# Altium footprint library MODULE.PcbLib: 35 footprints (part 3 of 3)
Each footprint in its own frame and in the unit in brackets; x right, y up, seen from the top. Pads: shape width x height; smd on the part's side, far side on the other; paste and mask are expansions set on the pad; w line width, h text height; cw(c..) or ccw(c..) is an arc to the next point about the centre after c.
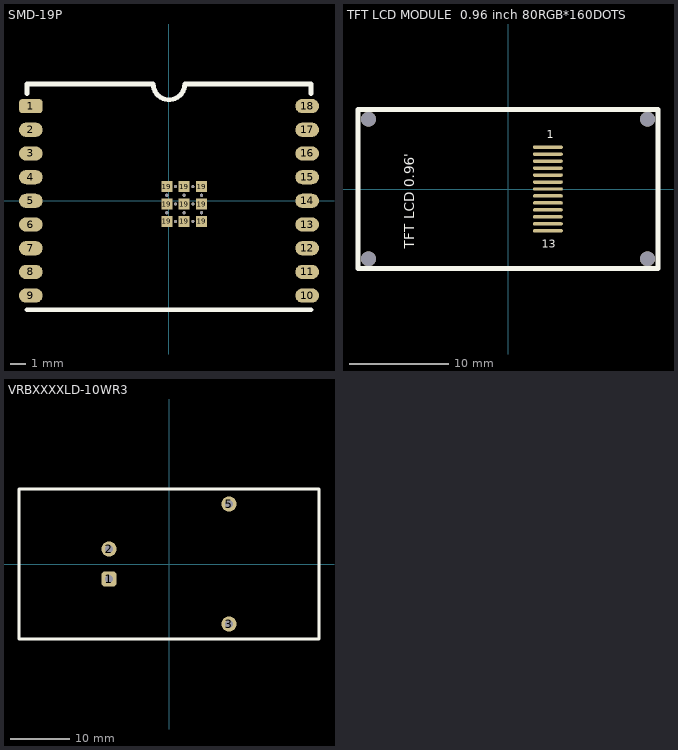
[diagram p2: the footprints below, top view; thin cyan lines are the x and y axes]

## SMD-19P [mm]
pads (39):
  rrect50% 1.5x0.9 smd mask+0.1: 1(-8.75,6)
  oval 1.5x0.9 smd mask+0.1: 2(-8.75,4.5) 3(-8.75,3) 4(-8.75,1.5) 5(-8.75,0) 6(-8.75,-1.5) 7(-8.75,-3) 8(-8.75,-4.5) 9(-8.75,-6) 10(8.75,-6) 11(8.75,-4.5) 12(8.75,-3) 13(8.75,-1.5) 14(8.75,0) 15(8.75,1.5) 16(8.75,3) 17(8.75,4.5) 18(8.75,6)
  rect 0.7x0.7 smd mask+0.1: 19(-0.14,-1.3) 19(-0.14,-0.2) 19(-0.14,0.9) 19(0.96,-1.3) 19(0.96,-0.2) 19(0.96,0.9) 19(2.06,-1.3) 19(2.06,-0.2) 19(2.06,0.9)
  round 0.2 hole 0.2: 19(-0.14,-0.75) 19(-0.14,0.35) 19(0.41,-1.3) 19(0.41,-0.2) 19(0.41,0.9) 19(0.96,-0.75) 19(0.96,0.35) 19(1.51,-1.3) 19(1.51,-0.2) 19(1.51,0.9) 19(2.06,-0.75) 19(2.06,0.35)
Top Overlay:
  lines w0.3: -9,-6.9 9,-6.9 ; -9,6.8 -9,7.4 -1,7.4 ccw(c0,7.4) 1,7.4 9,7.4 9,6.8
3D body "ESP32-C3-WROOM-02U-N4--3DModel-STEP-510211.STEP": height 3.36, standoff 0.01, extent -9,-6.9 9,7.4

## TFT LCD MODULE  0.96 inch 80RGB*160DOTS [mm]
pads (17):
  oval 3x0.35 smd: 1(4,4.2) 2(4,3.5) 3(4,2.8) 4(4,2.1) 5(4,1.4) 6(4,0.7) 7(4,0) 8(4,-0.7) 9(4,-1.4) 10(4,-2.1) 11(4,-2.8) 12(4,-3.5) 13(4,-4.2)
  round 1.5 hole 1.5: ""(-14,-7) ""(-14,7) ""(14,-7) ""(14,7)
Top Overlay:
  lines w0.5: -15.05,-8 -15.05,8 15.05,8 15.05,-8 -15.05,-8
  text "13" at 3.4,-5.9 h0.8
  text "1" at 3.867,5.1 h0.8
  text "TFT LCD 0.96'" at -9.417,-5.998 h1
3D body "0.96? IPS ?????.STEP": height 2, standoff 0.15, extent -14.811,-6.71 14.789,6.79

## VRBXXXXLD-10WR3 [mm]
pads (4):
  rrect50% 2.6x2.6 hole 1.3 mask+0.25: 1(-10.16,-2.54)
  round 2.6 hole 1.3 mask+0.25: 2(-10.16,2.54) 3(10.16,-10.16) 5(10.16,10.16)
Top Overlay:
  lines w0.5: -25.4,-12.7 -25.4,12.7 25.4,12.7 25.4,-12.7 -25.4,-12.7